# Altium footprint library My Footprint.PcbLib: 268 footprints (part 10 of 17)
Each footprint in its own frame and in the unit in brackets; x right, y up, seen from the top. Pads: shape width x height; smd on the part's side, far side on the other; paste and mask are expansions set on the pad; w line width, h text height; cw(c..) or ccw(c..) is an arc to the next point about the centre after c.
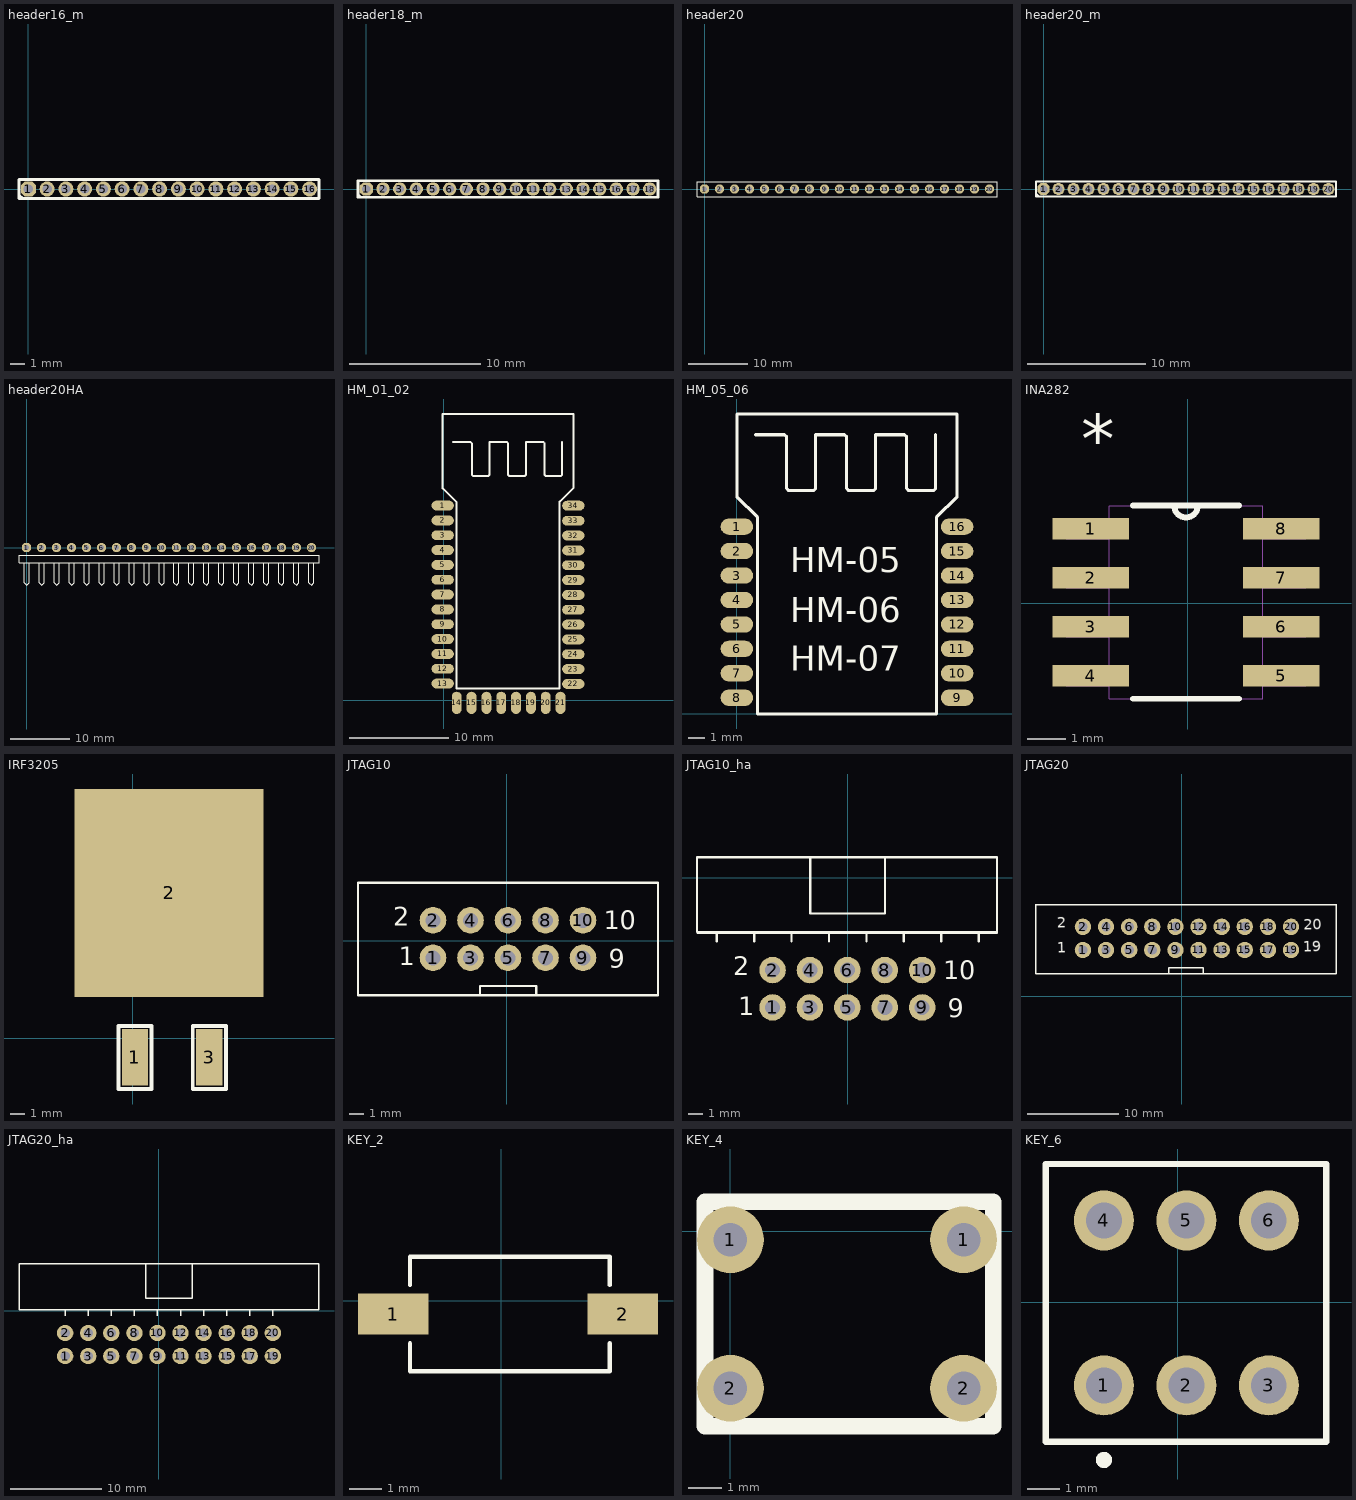
[diagram p9: the footprints below, top view; thin cyan lines are the x and y axes]

## header16_m [mil]
pads (16):
  oct 40x40 hole 25: 1(0,0)
  round 40 hole 25: 2(50,0) 3(100,0) 4(150,0) 5(200,0) 6(250,0) 7(300,0) 8(350,0) 9(400,0) 10(450,0) 11(500,0) 12(550,0) 13(600,0) 14(650,0) 15(700,0) 16(750,0)
Top Overlay:
  lines w8: -25,-16.67 -16.67,-25 ; -25,-25 -25,25 775,25 775,-25 -25,-25

## header18_m [mil]
pads (18):
  oct 40x40 hole 25: 1(0,0)
  round 40 hole 25: 2(50,0) 3(100,0) 4(150,0) 5(200,0) 6(250,0) 7(300,0) 8(350,0) 9(400,0) 10(450,0) 11(500,0) 12(550,0) 13(600,0) 14(650,0) 15(700,0) 16(750,0) 17(800,0) 18(850,0)
Top Overlay:
  lines w8: -25,-16.67 -16.67,-25 ; -25,-25 875,-25 875,25 -25,25 -25,-25

## header20 [mil]
pads (20):
  oct 62x62 hole 35: 1(0,0)
  round 62 hole 35: 2(100,0) 3(200,0) 4(300,0) 5(400,0) 6(500,0) 7(600,0) 8(700,0) 9(800,0) 10(900,0) 11(1000,0) 12(1100,0) 13(1200,0) 14(1300,0) 15(1400,0) 16(1500,0) 17(1600,0) 18(1700,0) 19(1800,0) 20(1900,0)
Top Overlay:
  lines w8: -50,-50 -50,50 25,50 1950,50 1950,-50 -50,-50
3D body "HEADER 20.STEP": height 397.64, standoff -59.06, extent -50,-50 1950,50

## header20_m [mil]
pads (20):
  oct 40x40 hole 25: 1(0,0)
  round 40 hole 25: 2(50,0) 3(100,0) 4(150,0) 5(200,0) 6(250,0) 7(300,0) 8(350,0) 9(400,0) 10(450,0) 11(500,0) 12(550,0) 13(600,0) 14(650,0) 15(700,0) 16(750,0) 17(800,0) 18(850,0) 19(900,0) 20(950,0)
Top Overlay:
  lines w8: -25,-16.67 -16.67,-25 ; -25,-25 975,-25 975,25 -25,25 -25,-25

## header20HA [mil]
pads (20):
  oct 62x62 hole 35: 1(0,0)
  round 62 hole 35: 2(100,0) 3(200,0) 4(300,0) 5(400,0) 6(500,0) 7(600,0) 8(700,0) 9(800,0) 10(900,0) 11(1000,0) 12(1100,0) 13(1200,0) 14(1300,0) 15(1400,0) 16(1500,0) 17(1600,0) 18(1700,0) 19(1800,0) 20(1900,0)
Top Overlay:
  lines w8: -16.67,-100 -16.67,-233.33 0,-250 16.67,-233.33 16.67,-100 ; 83.33,-100 83.33,-233.33 100,-250 116.67,-233.33 116.67,-100 ; 183.33,-100 183.33,-233.33 200,-250 216.67,-233.33 216.67,-100 ; 283.33,-100 283.33,-233.33 300,-250 316.67,-233.33 316.67,-100 ; 383.33,-100 383.33,-233.33 400,-250 416.67,-233.33 416.67,-100 ; 483.33,-100 483.33,-233.33 500,-250 516.67,-233.33 516.67,-100 ; 583.33,-100 583.33,-233.33 600,-250 616.67,-233.33 616.67,-100 ; 683.33,-100 683.33,-233.33 700,-250 716.67,-233.33 716.67,-100 ; 783.33,-100 783.33,-233.33 800,-250 816.67,-233.33 816.67,-100 ; 883.33,-100 883.33,-233.33 900,-250 916.67,-233.33 916.67,-100 ; 983.33,-100 983.33,-233.33 1000,-250 1016.67,-233.33 1016.67,-100 ; 1083.33,-100 1083.33,-233.33 1100,-250 1116.67,-233.33 1116.67,-100 ; 1183.33,-100 1183.33,-233.33 1200,-250 1216.67,-233.33 1216.67,-100 ; 1283.33,-100 1283.33,-233.33 1300,-250 1316.67,-233.33 1316.67,-100 ; 1383.33,-100 1383.33,-233.33 1400,-250 1416.67,-233.33 1416.67,-100 ; 1483.33,-100 1483.33,-233.33 1500,-250 1516.67,-233.33 1516.67,-100 ; 1583.33,-100 1583.33,-233.33 1600,-250 1616.67,-233.33 1616.67,-100 ; 1683.33,-100 1683.33,-233.33 1700,-250 1716.67,-233.33 1716.67,-100 ; 1783.33,-100 1783.33,-233.33 1800,-250 1816.67,-233.33 1816.67,-100 ; 1883.33,-100 1883.33,-233.33 1900,-250 1916.67,-233.33 1916.67,-100 ; -50,-100 1950,-100 1950,-50 25,-50 -50,-50 -50,-100
3D body "HEADER 20H.STEP": height 170.28, standoff -118.11, extent -50,-275.59 1950,50

## HM_01_02 [mil] "www.jnhuamao.cn"
pads (34):
  oval 88.74x39.37 smd: 1(-5,775.43) 2(-5,716.38) 3(-5,657.32) 4(-5,598.27) 5(-5,539.21) 6(-5,480.16) 7(-5,421.1) 8(-5,362.05) 9(-5,302.99) 10(-5,243.94) 11(-5,184.88) 12(-5,125.83) 13(-5,66.77) 22(515,65.43) 23(515,124.49) 24(515,183.54) 25(515,242.6) 26(515,301.65) 27(515,360.71) 28(515,419.76) 29(515,478.82) 30(515,537.87) 31(515,596.93) 32(515,655.98) 33(515,715.04) 34(515,775)
  oval 39.37x88.74 smd: 14(50.75,-10) 15(109.8,-10) 16(168.86,-10) 17(227.91,-10) 18(286.97,-10) 19(346.02,-10) 20(405.08,-10) 21(464.13,-10)
Top Overlay:
  lines w7.87: 35.75,1027.87 105.75,1027.87 110.75,1022.87 110.75,897.87 115.75,892.87 175.75,892.87 180.75,897.87 180.75,1027.87 250.75,1027.87 255.75,1022.87 255.75,897.87 260.75,892.87 320.75,892.87 325.75,897.87 325.75,1027.87 395.75,1027.87 400.75,1022.87 400.75,897.87 405.75,892.87 465.75,892.87 470.75,897.87 470.75,1027.87 ; -5,843.62 50.75,787.87 50.75,47.87 460.75,47.87 460.75,790.75 515,845 515,1140 -5,1140 -5,843.62

## HM_05_06 [mm] "www.jnhuamao.cn"
pads (16):
  oval 2x1 smd: 1(0,11.5) 2(0,10) 3(0,8.5) 4(0,7) 5(0,5.5) 6(0,4) 7(0,2.5) 8(0,1) 9(13.513,1) 10(13.513,2.5) 11(13.513,4) 12(13.513,5.5) 13(13.513,7) 14(13.513,8.5) 15(13.513,10) 16(13.513,11.5)
Top Overlay:
  lines w0.2: 1.143,17.145 2.921,17.145 3.048,17.018 3.048,13.843 3.175,13.716 4.699,13.716 4.826,13.843 4.826,17.145 6.604,17.145 6.731,17.018 6.731,13.843 6.858,13.716 8.382,13.716 8.509,13.843 8.509,17.145 10.287,17.145 10.414,17.018 10.414,13.843 10.541,13.716 12.065,13.716 12.192,13.843 12.192,17.145 ; 0,13.335 1.27,12.065 1.27,0 12.243,0 12.243,12.065 13.513,13.335 13.513,18.415 0,18.415 0,13.335
  text "HM-06" at 3.277,5.639 h1.52
  text "HM-07" at 3.277,2.642 h1.52
  text "HM-05" at 3.277,8.687 h1.52

## INA282 [mil]
pads (8):
  rect 78x22 smd: 1(-99,76) 2(-99,26) 3(-99,-24) 4(-99,-74) 5(95,-74) 6(95,-24) 7(95,26) 8(95,76)
Top Overlay:
  lines w6: -56.08,-97.5 52.08,-97.5 ; -56.08,99.5 52.08,99.5 ; -14,99.5 ccw(c-2,99.5) 10,99.5
  text "*" at -109,143 h50
Mechanical 1:
  lines w0: -14,99.5 ccw(c-2,99.5) 10,99.5 ; -124,-84 -80.5,-84 -80.5,-64 -124,-64 -124,-84 ; -124,-34 -80.5,-34 -80.5,-14 -124,-14 -124,-34 ; -124,16 -80.5,16 -80.5,36 -124,36 -124,16 ; -124,66 -80.5,66 -80.5,86 -124,86 -124,66 ; -80.5,-97.5 -80.5,99.5 76.5,99.5 76.5,-97.5 -80.5,-97.5 ; 76.5,-84 120,-84 120,-64 76.5,-64 76.5,-84 ; 76.5,-34 120,-34 120,-14 76.5,-14 76.5,-34 ; 76.5,16 120,16 120,36 76.5,36 76.5,16 ; 76.5,66 120,66 120,86 76.5,86 76.5,66
  text "*" at -109,143 h50
3D body "D0008A.stp": height 61.61, standoff -2.37, extent -118.1,-95.46 118.12,97.45

## IRF3205 [mil]
pads (3):
  rect 70x150 smd: 1(6,-50) 3(203,-50)
  rect 500x550 smd: 2(96,385)
Top Overlay:
  lines w10: -134,145 -134,535 -116,553 318,553 331,540 331,145 -134,145 ; -38,-134 50,-134 50,33 -38,33 -38,-134 ; 159,-134 159,33 247,33 247,-134 159,-134

## JTAG10 [mm] "AVR FPGA"
pads (10):
  round 1.8 hole 1.016: 1(-4.99,-1.16) 2(-4.99,1.38) 3(-2.45,-1.16) 4(-2.45,1.38) 5(0.09,-1.16) 6(0.09,1.38) 7(2.63,-1.16) 8(2.63,1.38) 9(5.17,-1.16) 10(5.17,1.38)
Top Overlay:
  lines w0.152: -1.815,-3.7 -1.815,-3.065 1.995,-3.065 1.995,-3.7 ; -10.07,-3.7 10.25,-3.7 10.25,3.92 -10.07,3.92 -10.07,-3.7
  text "10" at 6.59,0.77 h1.27
  text "9" at 6.91,-1.84 h1.27
  text "1" at -7.32,-1.68 h1.27
  text "2" at -7.67,1.01 h1.27
3D body "BH-10.STEP": height 8.84, standoff -3.3, extent -10.073,-4.346 10.287,4.854

## JTAG10_ha [mm]
pads (10):
  round 1.8 hole 1.016: 1(-5.09,-8.81) 2(-5.09,-6.27) 3(-2.55,-8.81) 4(-2.55,-6.27) 5(-0.01,-8.81) 6(-0.01,-6.27) 7(2.53,-8.81) 8(2.53,-6.27) 9(5.07,-8.81) 10(5.07,-6.27)
Top Overlay:
  lines w0.152: -10.17,-3.73 10.15,-3.73 ; -8.877,-4.329 -8.877,-3.694 ; -6.337,-4.329 -6.337,-3.694 ; -3.797,-4.329 -3.797,-3.694 ; -2.527,1.386 -2.527,-2.424 2.553,-2.424 2.553,1.386 ; -1.257,-4.329 -1.257,-3.694 ; 1.283,-4.329 1.283,-3.694 ; 3.823,-4.329 3.823,-3.694 ; 6.363,-4.329 6.363,-3.694 ; 8.903,-4.329 8.903,-3.694 ; -10.22,-3.694 10.15,-3.694 10.15,1.386 -10.22,1.386 -10.22,-3.694
  text "10" at 6.49,-6.88 h1.27
  text "9" at 6.81,-9.49 h1.27
  text "1" at -7.42,-9.33 h1.27
  text "2" at -7.77,-6.64 h1.27

## JTAG20 [mm] "JLINK"
pads (20):
  round 1.8 hole 1.016: 1(-10.877,5.106) 2(-10.877,7.646) 3(-8.337,5.106) 4(-8.337,7.646) 5(-5.797,5.106) 6(-5.797,7.646) 7(-3.257,5.106) 8(-3.257,7.646) 9(-0.717,5.106) 10(-0.717,7.646) 11(1.823,5.106) 12(1.823,7.646) 13(4.363,5.106) 14(4.363,7.646) 15(6.903,5.106) 16(6.903,7.646) 17(9.443,5.106) 18(9.443,7.646) 19(11.983,5.106) 20(11.983,7.646)
Top Overlay:
  lines w0.152: -16.03,10.12 -16.03,2.5 16.92,2.5 16.92,10.12 ; -16.017,10.096 16.9,10.096 ; -1.445,2.5 -1.445,3.135 2.365,3.135 2.365,2.5
  text "20" at 13.36,6.95 h2
  text "19" at 13.34,4.53 h2
  text "2" at -13.68,7.18 h2
  text "1" at -13.71,4.44 h2
3D body "BH-20.STEP": height 8.84, standoff -3.3, extent -15.895,1.976 17.165,11.176

## JTAG20_ha [mm]
pads (20):
  round 1.8 hole 1.016: 1(-10.327,-5.014) 2(-10.327,-2.474) 3(-7.787,-5.014) 4(-7.787,-2.474) 5(-5.247,-5.014) 6(-5.247,-2.474) 7(-2.707,-5.014) 8(-2.707,-2.474) 9(-0.167,-5.014) 10(-0.167,-2.474) 11(2.373,-5.014) 12(2.373,-2.474) 13(4.913,-5.014) 14(4.913,-2.474) 15(7.453,-5.014) 16(7.453,-2.474) 17(9.993,-5.014) 18(9.993,-2.474) 19(12.533,-5.014) 20(12.533,-2.474)
Top Overlay:
  lines w0.152: -10.327,-0.569 -10.327,0.066 ; -7.787,-0.569 -7.787,0.066 ; -5.247,-0.569 -5.247,0.066 ; -2.707,-0.569 -2.707,0.066 ; -1.437,5.146 -1.437,1.336 3.643,1.336 3.643,5.146 ; -0.167,-0.569 -0.167,0.066 ; 2.373,-0.569 2.373,0.066 ; 4.913,-0.569 4.913,0.066 ; 7.453,-0.569 7.453,0.066 ; 9.993,-0.569 9.993,0.066 ; 12.533,-0.569 12.533,0.066 ; -15.407,0.066 -15.407,5.146 17.613,5.146 17.613,0.066 -15.407,0.066

## KEY_2 [mil] "贴片"
pads (2):
  rect 85x49.37 smd: 1(-129.57,-16.14) 2(146.02,-16.14)
Top Overlay:
  lines w5: -109.57,-51.22 -109.57,-85.04 130.43,-85.04 130.43,-51.22 ; -109.57,18.78 -109.57,52.76 130.43,52.76 130.43,18.78
3D body "SW3dPS-TVBU19.STEP": height -20, standoff -118.43, extent -110.07,-87.83 130.09,57.84

## KEY_4 [mm]
pads (4):
  round 2 hole 1: 1(0,-0.254) 1(6.985,-0.254) 2(0,-4.699) 2(6.985,-4.699)
Top Overlay:
  lines w0.5: -0.762,-5.842 -0.762,0.889 7.874,0.889 7.874,-5.842 -0.762,-5.842
3D body "SW3dPS-Touche DTS-6X.STEP": height 4, standoff -3.56, extent -0.404,-5.64 7.516,0.56

## KEY_6 [mm]
pads (6):
  round 1.85 hole 1.1: 1(-2.273,-2.556) 2(0.267,-2.556) 3(2.807,-2.556) 4(-2.273,2.524) 5(0.267,2.524) 6(2.807,2.524)
Top Overlay:
  circle w0.25: c-2.274,-4.852 r0.125
  lines w0.2: -4.064,-4.296 4.572,-4.296 4.572,4.264 -4.064,4.264 -4.064,-4.296
3D body "TL 2201.step": height 14, standoff -3.5, extent -3.996,-4.25 4.504,4.25